# Altium footprint library adafruit.PCBLIB: 648 footprints (part 28 of 41)
Each footprint in its own frame and in the unit in brackets; x right, y up, seen from the top. Pads: shape width x height; smd on the part's side, far side on the other; paste and mask are expansions set on the pad; w line width, h text height; cw(c..) or ccw(c..) is an arc to the next point about the centre after c.
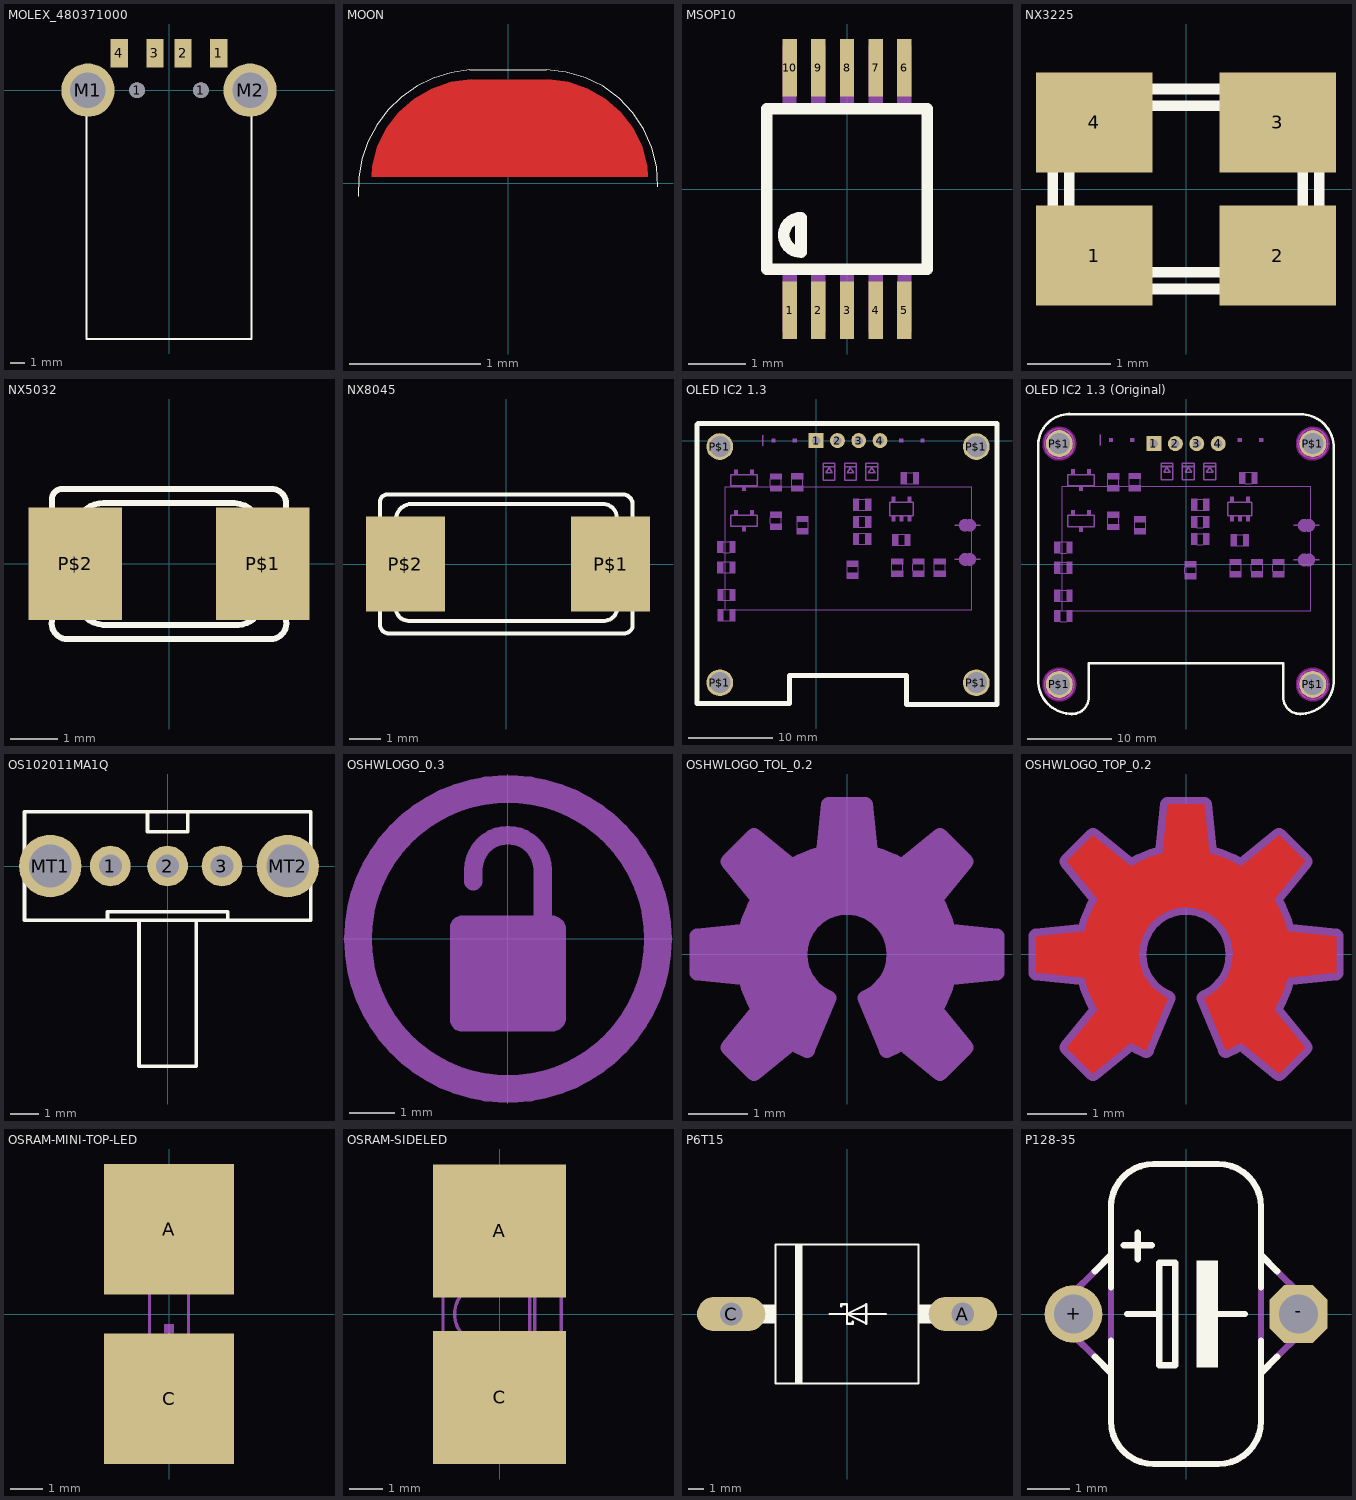
[diagram p27: the footprints below, top view; thin cyan lines are the x and y axes]

## MOLEX_480371000 [mm]
pads (8):
  round 1.1 hole 1.1: 1(-2.25,0) 1(2.25,0)
  rect 1.2x2 smd: 1(3.5,2.6) 2(1,2.6) 3(-1,2.6) 4(-3.5,2.6)
  round 3.75 hole 2.5: M1(-5.7,0) M2(5.7,0)
Top Overlay:
  lines w0.127: -5.8,0 -5.8,-17.5 5.8,-17.5 5.8,0

## MOON [mil]
Top Layer:
  region: -41,2 42,2 41.8,5.05 40.23,10.97 37.52,16.46 33.8,21.31 29.21,25.35 23.91,28.42 18.12,30.39 12.05,31.2 9,31 -8,31 -11.05,31.2 -17.12,30.39 -22.91,28.42 -28.21,25.35 -32.8,21.31 -36.52,16.46 -39.23,10.97 -40.8,5.05
Top Overlay:
  lines w0: -45,-4 cw(c-9.25,-1.75) -11.5,34 11.5,34 cw(c10.74,-0.26) 45,-1

## MSOP10 [mm]
pads (10):
  rect 0.25x1 smd: 1(-1,-2.113) 2(-0.5,-2.113) 3(0,-2.113) 4(0.5,-2.113) 5(1,-2.113) 6(1,2.113) 7(0.5,2.113) 8(0,2.113) 9(-0.5,2.113) 10(-1,2.113)
Top Overlay:
  lines w0.203: -1.4,-1.4 -1.4,1.4 1.4,1.4 1.4,-1.4 -1.4,-1.4 ; -0.8,-1.1 cw(c-0.8,-0.8) -0.8,-0.5 -0.8,-1.1
Mechanical 16:
  region: -0.876,2.5 -1.126,2.5 -1.126,1.5 -0.876,1.5
  region: -0.376,2.5 -0.626,2.5 -0.626,1.5 -0.376,1.5
  region: 0.124,2.5 -0.125,2.5 -0.125,1.5 0.124,1.5
  region: 0.624,2.5 0.374,2.5 0.374,1.5 0.624,1.5
  region: 1.124,2.5 0.875,2.5 0.875,1.5 1.124,1.5
  rectangle: 0.876,-2.5 1.126,-1.5
  rectangle: 0.376,-2.5 0.626,-1.5
  rectangle: -0.124,-2.5 0.125,-1.5
  rectangle: -0.624,-2.5 -0.374,-1.5
  rectangle: -1.124,-2.5 -0.875,-1.5

## NX3225 [mil]
pads (4):
  rect 55.12x47.24 smd: 1(-43.31,-31.5) 2(43.31,-31.5) 3(43.31,31.5) 4(-43.31,31.5)
Top Overlay:
  lines w5: -62.99,-47.24 -62.99,47.24 62.99,47.24 62.99,-47.24 -62.99,-47.24 ; -55.12,-26.87 ccw(c-42.62,-26.87) -42.62,-39.37 42.62,-39.37 ccw(c42.62,-26.87) 55.12,-26.87 55.12,26.87 ccw(c42.62,26.87) 42.62,39.37 -42.62,39.37 ccw(c-42.62,26.87) -55.12,26.87 -55.12,-26.87

## NX5032 [mm]
pads (2):
  rect 2x2.4 smd: P$1(2,0) P$2(-2,0)
Top Overlay:
  lines w0.127: -2.5,-1.217 ccw(c-2.167,-1.267) -2.217,-1.6 2.217,-1.6 ccw(c2.167,-1.267) 2.5,-1.217 2.5,1.284 ccw(c2.184,1.284) 2.184,1.6 -2.276,1.6 ccw(c-2.276,1.376) -2.5,1.376 -2.5,-1.217 ; -2,-0.7 ccw(c-1.35,-0.65) -1.3,-1.3 1.4,-1.3 ccw(c1.45,-0.75) 2,-0.8 2,0.6 ccw(c1.35,0.65) 1.4,1.3 -1.4,1.3 ccw(c-1.4,0.7) -2,0.7 -2,-0.7

## NX8045 [mm]
pads (2):
  rect 2.5x3 smd: P$1(3.3,0) P$2(-3.2,0)
Top Overlay:
  lines w0.127: -4,-1.917 ccw(c-3.717,-1.917) -3.717,-2.2 3.717,-2.2 ccw(c3.717,-1.917) 4,-1.917 4,1.884 ccw(c3.684,1.884) 3.684,2.2 -3.776,2.2 ccw(c-3.776,1.976) -4,1.976 -4,-1.917 ; -3.5,-1.4 ccw(c-3.1,-1.4) -3.1,-1.8 3.1,-1.8 ccw(c3.1,-1.4) 3.5,-1.4 3.5,1.4 ccw(c3.05,1.45) 3.1,1.9 -3,1.9 ccw(c-3,1.4) -3.5,1.4 -3.5,-1.4

## OLED IC2 1.3 [mil] "OLED I2C 128x64 Screen"
pads (8):
  rect 70x70 hole 39.37: 1(0,0)
  round 70 hole 39.37: 2(100,0) 3(200,0) 4(300,0)
  round 125.98 hole 98.43: P$1(-452.76,-1137.95) P$1(-452.76,-27.95) P$1(752.76,-1137.95) P$1(752.76,-27.95)
Top Overlay:
  lines w23.62: -560,75 -560,-1235 -125,-1235 -125,-1105 425,-1105 425,-1240 850,-1240 850,80 -555,80
Mechanical 18:
  rectangle: 490,-10 510,10
  rectangle: -210,-10 -190,10
  rectangle: -110,-10 -90,10
  rectangle: -10,-10 10,10
  rectangle: 90,-10 110,10
  rectangle: 190,-10 210,10
  rectangle: 290,-10 310,10
  rectangle: 390,-10 410,10
  lines w5: -426.7,-794.8 -426.7,-216.06 730.78,-216.06 730.78,-794.8 -426.7,-794.8
  lines w6: -250,-25 -250,25
  text "PCB EDGE" at 49.68,-1019.21 h49.6
  text "41" at 225.58,-138.17 h37.2
  text "41" at 125.58,-138.17 h37.2
  text "41" at 25.58,-138.17 h37.2
Mechanical 19:
  region: 142.43,-620.77 142.43,-650.3 199.52,-650.3 199.52,-620.77
  region: 142.43,-563.77 142.43,-593.3 199.52,-593.3 199.52,-563.77
  region: 448.26,-262.71 428.58,-262.71 428.58,-288.31 448.26,-288.31
  region: 373.46,-262.71 353.78,-262.71 353.78,-288.31 373.46,-288.31
  region: 373.46,-355.23 353.78,-355.23 353.78,-380.83 373.46,-380.83
  region: 410.86,-355.23 391.18,-355.23 391.18,-380.83 410.86,-380.83
  region: 448.26,-355.23 428.58,-355.23 428.58,-380.83 448.26,-380.83
  region: 427.02,-148.18 397.49,-148.18 397.49,-205.27 427.02,-205.27
  region: 484.02,-148.18 454.49,-148.18 454.49,-205.27 484.02,-205.27
  region: 387.02,-438.18 357.49,-438.18 357.49,-495.27 387.02,-495.27
  region: 444.02,-438.18 414.49,-438.18 414.49,-495.27 444.02,-495.27
  region: 233.46,-119.21 233.46,-127.08 288.58,-127.08 288.58,-119.21
  region: 133.46,-119.21 133.46,-127.08 188.58,-127.08 188.58,-119.21
  region: 33.46,-119.21 33.46,-127.08 88.58,-127.08 88.58,-119.21
  rectangle: 230.02,-330.36 259.55,-273.27
  rectangle: 173.02,-330.36 202.55,-273.27
  rectangle: 230.02,-410.36 259.55,-353.27
  rectangle: 173.02,-410.36 202.55,-353.27
  rectangle: 230.02,-490.36 259.55,-433.27
  rectangle: 173.02,-490.36 202.55,-433.27
  region: -92.57,-411.08 -92.57,-440.61 -35.48,-440.61 -35.48,-411.08
  region: -92.57,-354.08 -92.57,-383.61 -35.48,-383.61 -35.48,-354.08
  region: -217.57,-210.77 -217.57,-240.3 -160.48,-240.3 -160.48,-210.77
  region: -217.57,-153.77 -217.57,-183.3 -160.48,-183.3 -160.48,-153.77
  region: -160.39,-363.08 -160.39,-333.55 -217.48,-333.55 -217.48,-363.08
  region: -160.39,-420.08 -160.39,-390.55 -217.48,-390.55 -217.48,-420.08
  region: -60.39,-182.77 -60.39,-153.24 -117.48,-153.24 -117.48,-182.77
  region: -60.39,-239.77 -60.39,-210.24 -117.48,-210.24 -117.48,-239.77
  rectangle: -384.98,-349.08 -366.98,-326.08
  rectangle: -310.98,-349.08 -292.98,-326.08
  rectangle: -347.98,-428.08 -329.98,-405.08
  rectangle: -384.98,-158.77 -366.98,-135.77
  rectangle: -310.98,-158.77 -292.98,-135.77
  rectangle: -347.98,-237.77 -329.98,-214.77
  region: 352.43,-610.77 352.43,-640.3 409.52,-640.3 409.52,-610.77
  region: 352.43,-553.77 352.43,-583.3 409.52,-583.3 409.52,-553.77
  rectangle: -407.58,-849.14 -378.05,-792.05
  rectangle: -464.58,-849.14 -435.05,-792.05
  rectangle: -407.58,-754.14 -378.05,-697.05
  rectangle: -464.58,-754.14 -435.05,-697.05
  region: 552.43,-610.77 552.43,-640.3 609.52,-640.3 609.52,-610.77
  region: 552.43,-553.77 552.43,-583.3 609.52,-583.3 609.52,-553.77
  region: -435.58,-472.27 -465.11,-472.27 -465.11,-529.36 -435.58,-529.36
  region: -378.58,-472.27 -408.11,-472.27 -408.11,-529.36 -378.58,-529.36
  region: 452.43,-610.77 452.43,-640.3 509.52,-640.3 509.52,-610.77
  region: 452.43,-553.77 452.43,-583.3 509.52,-583.3 509.52,-553.77
  region: -435.58,-567.27 -465.11,-567.27 -465.11,-624.36 -435.58,-624.36
  region: -378.58,-567.27 -408.11,-567.27 -408.11,-624.36 -378.58,-624.36
  lines w4: -436.58,-846.53 -406.58,-846.53 ; -436.58,-751.53 -406.58,-751.53 ; -436.58,-621.84 -407.56,-621.84 ; -436.58,-569.88 -406.58,-569.88 ; -436.58,-526.84 -407.56,-526.84 ; -436.58,-474.88 -406.58,-474.88 ; -435.6,-794.57 -406.58,-794.57 ; -435.6,-699.57 -406.58,-699.57 ; -214.96,-391.1 -214.96,-362.08 ; -214.96,-211.77 -214.96,-181.77 ; -163,-392.08 -163,-362.08 ; -163,-211.77 -163,-182.75 ; -114.96,-210.79 -114.96,-181.77 ; -89.96,-412.08 -89.96,-382.08 ; -63,-211.77 -63,-181.77 ; -38,-412.08 -38,-383.06 ; 145.04,-621.77 145.04,-591.77 ; 197,-621.77 197,-592.75 ; 201.02,-487.75 231.02,-487.75 ; 201.02,-407.75 231.02,-407.75 ; 201.02,-327.75 231.02,-327.75 ; 202,-435.79 231.02,-435.79 ; 202,-355.79 231.02,-355.79 ; 202,-275.79 231.02,-275.79 ; 355.04,-611.77 355.04,-581.77 ; 386.02,-492.75 415.04,-492.75 ; 386.02,-440.79 416.02,-440.79 ; 407,-611.77 407,-582.75 ; 426.02,-202.75 455.04,-202.75 ; 426.02,-150.79 456.02,-150.79 ; 455.04,-611.77 455.04,-581.77 ; 507,-611.77 507,-582.75 ; 555.04,-611.77 555.04,-581.77 ; 607,-611.77 607,-582.75
  lines w6: 651.02,-558.66 671.02,-558.66 ; 651.02,-398.03 671.02,-398.03 ; 751.02,-558.66 771.02,-558.66 ; 751.02,-398.03 771.02,-398.03 ; -400.89,-403.08 -277.07,-403.08 -277.07,-351.08 -400.89,-351.08 -400.89,-403.08 ; -400.89,-212.77 -277.07,-212.77 -277.07,-160.77 -400.89,-160.77 -400.89,-212.77 ; 33.46,-186.14 88.58,-186.14 88.58,-107.4 33.46,-107.4 33.46,-186.14 ; 45.27,-150.71 76.77,-150.71 61.02,-127.08 45.27,-150.71 ; 133.46,-186.14 188.58,-186.14 188.58,-107.4 133.46,-107.4 133.46,-186.14 ; 145.27,-150.71 176.77,-150.71 161.02,-127.08 145.27,-150.71 ; 233.46,-186.14 288.58,-186.14 288.58,-107.4 233.46,-107.4 233.46,-186.14 ; 245.27,-150.71 276.77,-150.71 261.02,-127.08 245.27,-150.71 ; 345.02,-353.68 457.02,-353.68 457.02,-289.86 345.02,-289.86 345.02,-353.68
  lines w50: 701.02,-563.66 cw(c701.02,-558.66) 701.02,-553.66 ; 701.02,-403.03 cw(c701.02,-398.03) 701.02,-393.03 ; 721.02,-563.66 ccw(c721.02,-558.66) 721.02,-553.66 ; 721.02,-403.03 ccw(c721.02,-398.03) 721.02,-393.03
  text "30" at 563.46,-688.03 h27.2
  text "20" at 281.96,-688.03 h27.2
  text "10" at 8.34,-688.03 h27.2
  text "1" at -239.69,-684.09 h27.2
3D body "1 3 OLED ICC .STEP": height 208.66, standoff -216.54, extent -556.78,-1240.78 846.77,82.05

## OLED IC2 1.3 (Original) [mm] "OLED I2C 128x64 Screen"
pads (8):
  rect 1.778x1.778 hole 1: 1(-3.81,14.25)
  round 1.778 hole 1: 2(-1.27,14.25) 3(1.27,14.25) 4(3.81,14.25)
  round 3.2 hole 2.5: P$1(-15,-14.25) P$1(-15,14.25) P$1(15,-14.25) P$1(15,14.25)
Top Overlay:
  lines w0.3: -17.5,14.25 -17.5,-13.75 ccw(c-13.5,-13.75) -13.5,-17.75 ccw(c-13.5,-15.75) -11.5,-15.75 -11.5,-11.75 11.5,-11.75 11.5,-15.75 ccw(c13.5,-15.75) 13.5,-17.75 ccw(c13.5,-13.75) 17.5,-13.75 17.5,13.75 ccw(c13.5,13.75) 13.5,17.75 -13.5,17.75 ccw(c-13.75,14) -17.5,14.25
Keep-Out Layer:
  circle w2.032: c-15,14.25 r1
  circle w2.032: c15,-14.25 r1
  circle w2.032: c-15,-14.25 r1
  circle w2.032: c15,14.25 r1
Mechanical 1:
  lines w0: -17.5,14.25 -17.5,-13.75 ccw(c-13.5,-13.75) -13.5,-17.75 ccw(c-13.5,-15.75) -11.5,-15.75 -11.5,-11.75 11.5,-11.75 11.5,-15.75 ccw(c13.5,-15.75) 13.5,-17.75 ccw(c13.5,-13.75) 17.5,-13.75 17.5,13.75 ccw(c13.5,13.75) 13.5,17.75 -13.5,17.75 ccw(c-13.75,14) -17.5,14.25
Mechanical 2:
  circle w0.152: c-15,14.25 r1.75
  circle w0.152: c15,-14.25 r1.75
  circle w0.152: c-15,-14.25 r1.75
  circle w0.152: c15,14.25 r1.75
Mechanical 18:
  rectangle: 6.096,14.426 6.604,14.934
  rectangle: 3.556,14.426 4.064,14.934
  rectangle: 1.016,14.426 1.524,14.934
  rectangle: -1.524,14.426 -1.016,14.934
  rectangle: -4.064,14.426 -3.556,14.934
  rectangle: -6.604,14.426 -6.096,14.934
  rectangle: -9.144,14.426 -8.636,14.934
  rectangle: 8.636,14.426 9.144,14.934
  lines w0.127: -14.648,-5.508 14.752,-5.508 14.752,9.192 -14.648,9.192 -14.648,-5.508
  lines w0.152: -10.16,14.045 -10.16,15.315
  text "41" at -3.16,11.17 h0.94
  text "41" at -0.62,11.17 h0.94
  text "41" at 1.92,11.17 h0.94
  text "PCB EDGE" at -2.548,-11.208 h1.26
Mechanical 19:
  region: -13.426,0.271 -14.176,0.271 -14.176,-1.179 -13.426,-1.179
  region: -14.874,0.271 -15.624,0.271 -15.624,-1.179 -14.874,-1.179
  region: 7.682,0.614 7.682,-0.136 9.132,-0.136 9.132,0.614
  region: 7.682,-0.834 7.682,-1.584 9.132,-1.584 9.132,-0.834
  region: -13.426,2.684 -14.176,2.684 -14.176,1.234 -13.426,1.234
  region: -14.874,2.684 -15.624,2.684 -15.624,1.234 -14.874,1.234
  region: 10.222,0.614 10.222,-0.136 11.672,-0.136 11.672,0.614
  region: 10.222,-0.834 10.222,-1.584 11.672,-1.584 11.672,-0.834
  rectangle: -15.61,-4.475 -14.86,-3.025
  rectangle: -14.162,-4.475 -13.412,-3.025
  rectangle: -15.61,-6.888 -14.86,-5.438
  rectangle: -14.162,-6.888 -13.412,-5.438
  region: 5.142,0.614 5.142,-0.136 6.592,-0.136 6.592,0.614
  region: 5.142,-0.834 5.142,-1.584 6.592,-1.584 6.592,-0.834
  rectangle: -12.649,8.641 -12.191,9.225
  rectangle: -11.709,10.647 -11.252,11.231
  rectangle: -13.588,10.647 -13.131,11.231
  rectangle: -12.649,3.807 -12.191,4.391
  rectangle: -11.709,5.813 -11.252,6.397
  rectangle: -13.588,5.813 -13.131,6.397
  region: -5.344,8.59 -5.344,9.34 -6.794,9.34 -6.794,8.59
  region: -5.344,10.038 -5.344,10.788 -6.794,10.788 -6.794,10.038
  region: -7.884,4.01 -7.884,4.76 -9.334,4.76 -9.334,4.01
  region: -7.884,5.458 -7.884,6.208 -9.334,6.208 -9.334,5.458
  region: -9.336,10.774 -9.336,10.024 -7.886,10.024 -7.886,10.774
  region: -9.336,9.326 -9.336,8.576 -7.886,8.576 -7.886,9.326
  region: -6.161,5.686 -6.161,4.936 -4.711,4.936 -4.711,5.686
  region: -6.161,4.238 -6.161,3.488 -4.711,3.488 -4.711,4.238
  rectangle: 0.585,2.225 1.335,3.675
  rectangle: 2.033,2.225 2.783,3.675
  rectangle: 0.585,4.257 1.335,5.707
  rectangle: 2.033,4.257 2.783,5.707
  rectangle: 0.585,6.289 1.335,7.739
  rectangle: 2.033,6.289 2.783,7.739
  region: -2.96,11.652 -2.96,11.452 -1.56,11.452 -1.56,11.652
  region: -0.42,11.652 -0.42,11.452 0.98,11.452 0.98,11.652
  region: 2.12,11.652 2.12,11.452 3.52,11.452 3.52,11.652
  region: 7.468,3.55 6.718,3.55 6.718,2.1 7.468,2.1
  region: 6.02,3.55 5.27,3.55 5.27,2.1 6.02,2.1
  region: 8.484,10.916 7.734,10.916 7.734,9.466 8.484,9.466
  region: 7.036,10.916 6.286,10.916 6.286,9.466 7.036,9.466
  region: 7.576,5.657 7.076,5.657 7.076,5.007 7.576,5.007
  region: 6.626,5.657 6.126,5.657 6.126,5.007 6.626,5.007
  region: 5.676,5.657 5.176,5.657 5.176,5.007 5.676,5.007
  region: 5.676,8.007 5.176,8.007 5.176,7.357 5.676,7.357
  region: 7.576,8.007 7.076,8.007 7.076,7.357 7.576,7.357
  region: -0.192,0.36 -0.192,-0.39 1.258,-0.39 1.258,0.36
  region: -0.192,-1.088 -0.192,-1.838 1.258,-1.838 1.258,-1.088
  lines w0.102: -14.899,-6.822 -14.137,-6.822 ; -14.899,-4.409 -14.137,-4.409 ; -14.899,-1.115 -14.162,-1.115 ; -14.899,0.205 -14.137,0.205 ; -14.899,1.298 -14.162,1.298 ; -14.899,2.618 -14.137,2.618 ; -14.874,-5.502 -14.137,-5.502 ; -14.874,-3.089 -14.137,-3.089 ; -9.27,4.746 -9.27,5.483 ; -9.27,9.301 -9.27,10.063 ; -7.95,4.721 -7.95,5.483 ; -7.95,9.301 -7.95,10.038 ; -6.73,9.326 -6.73,10.063 ; -6.095,4.213 -6.095,4.975 ; -5.41,9.301 -5.41,10.063 ; -4.775,4.213 -4.775,4.95 ; -0.126,-1.113 -0.126,-0.351 ; 1.194,-1.113 1.194,-0.376 ; 1.296,2.291 2.058,2.291 ; 1.296,4.323 2.058,4.323 ; 1.296,6.355 2.058,6.355 ; 1.321,3.611 2.058,3.611 ; 1.321,5.643 2.058,5.643 ; 1.321,7.675 2.058,7.675 ; 5.208,-0.859 5.208,-0.097 ; 5.995,2.164 6.732,2.164 ; 5.995,3.484 6.757,3.484 ; 6.528,-0.859 6.528,-0.122 ; 7.011,9.53 7.748,9.53 ; 7.011,10.85 7.773,10.85 ; 7.748,-0.859 7.748,-0.097 ; 9.068,-0.859 9.068,-0.122 ; 10.288,-0.859 10.288,-0.097 ; 11.608,-0.859 11.608,-0.122
  lines w0.152: 12.726,0.49 13.234,0.49 ; 12.726,4.57 13.234,4.57 ; 15.266,0.49 15.774,0.49 ; 15.266,4.57 15.774,4.57 ; -13.992,4.442 -13.992,5.762 -10.847,5.762 -10.847,4.442 -13.992,4.442 ; -13.992,9.276 -13.992,10.596 -10.847,10.596 -10.847,9.276 -13.992,9.276 ; -2.96,9.952 -2.96,11.952 -1.56,11.952 -1.56,9.952 -2.96,9.952 ; -2.66,10.852 -2.26,11.452 -1.86,10.852 -2.66,10.852 ; -0.42,9.952 -0.42,11.952 0.98,11.952 0.98,9.952 -0.42,9.952 ; -0.12,10.852 0.28,11.452 0.68,10.852 -0.12,10.852 ; 2.12,9.952 2.12,11.952 3.52,11.952 3.52,9.952 2.12,9.952 ; 2.42,10.852 2.82,11.452 3.22,10.852 2.42,10.852 ; 4.954,5.696 4.954,7.317 7.798,7.317 7.798,5.696 4.954,5.696
  lines w1.27: 13.996,0.363 cw(c13.996,0.49) 13.996,0.617 ; 13.996,4.443 cw(c13.996,4.57) 13.996,4.697 ; 14.504,0.363 ccw(c14.504,0.49) 14.504,0.617 ; 14.504,4.443 ccw(c14.504,4.57) 14.504,4.697
  text "1" at -9.898,-2.696 h0.69
  text "10" at -3.598,-2.796 h0.69
  text "20" at 3.352,-2.796 h0.69
  text "30" at 10.502,-2.796 h0.69

## OS102011MA1Q [mil]
pads (5):
  round 56 hole 31.5: 1(-78.74,0) 2(0,0) 3(74.8,0)
  round 86 hole 59.06: MT1(-161.42,0) MT2(165.35,0)
Top Overlay:
  lines w5: -82.68,-74.8 -39.37,-74.8 ; -82.68,-74.8 -196.85,-74.8 -196.85,74.8 -27.56,74.8 ; -82.68,-74.8 -82.68,-62.99 82.68,-62.99 82.68,-74.8 ; -39.37,-74.8 39.37,-74.8 ; -39.37,-74.8 -39.37,-275.59 39.37,-275.59 39.37,-74.8 ; -27.56,74.8 27.56,74.8 ; -27.56,74.8 -27.56,47.24 27.56,47.24 27.56,74.8 ; 27.56,74.8 196.85,74.8 196.85,-74.8 82.68,-74.8 ; 39.37,-74.8 82.68,-74.8

## OSHWLOGO_0.3 [mil]
Mechanical 16:
  circle w24: c0,0 r130
  region: 50,-68 50,-70.39 48.17,-74.8 44.8,-78.17 40.39,-80 38,-80 -40,-80 -41.99,-80 -45.66,-78.48 -48.48,-75.66 -50,-71.99 -50,-70 -50,10 -50,11.99 -48.48,15.66 -45.66,18.48 -41.99,20 -40,20 38,20 40.39,20 44.8,18.17 48.17,14.8 50,10.39 50,8
  lines w16: -30,50 -30,60 cw(c0,60) 0,90 cw(c0,60) 30,60 30,20

## OSHWLOGO_TOL_0.2 [mil]
Mechanical 16:
  region: 26.31,-63.52 27.63,-62.97 30.21,-61.77 32.74,-60.47 35.22,-59.06 36.43,-58.3 61.57,-78.8 78.8,-61.57 58.3,-36.43 59.81,-34.01 62.42,-28.94 64.61,-23.67 66.35,-18.24 66.99,-15.46 99.26,-12.19 99.26,12.19 66.99,15.46 66.35,18.24 64.61,23.67 62.42,28.94 59.81,34.01 58.3,36.43 78.8,61.57 61.57,78.8 36.43,58.3 34.01,59.81 28.94,62.42 23.67,64.61 18.24,66.35 15.46,66.99 12.19,99.26 -12.19,99.26 -15.46,66.99 -18.24,66.35 -23.67,64.61 -28.94,62.42 -34.01,59.81 -36.43,58.3 -61.57,78.8 -78.8,61.57 -58.3,36.43 -59.81,34.01 -62.42,28.94 -64.61,23.67 -66.35,18.24 -66.99,15.46 -99.26,12.19 -99.26,-12.19 -66.99,-15.46 -66.35,-18.24 -64.61,-23.67 -62.42,-28.94 -59.81,-34.01 -58.3,-36.43 -78.8,-61.57 -61.57,-78.8 -36.43,-58.3 -35.22,-59.06 -32.74,-60.47 -30.21,-61.77 -27.63,-62.97 -26.31,-63.52 -11.96,-28.87 -16.07,-26.8 -23.16,-20.99 -28.25,-13.36 -30.91,-4.59 -31.25,0 -30.97,4.21 -28.72,12.31 -24.4,19.52 -18.31,25.32 -10.89,29.29 -2.68,31.13 5.72,30.72 13.7,28.08 20.7,23.41 26.19,17.04 29.79,9.44 31.22,1.15 30.4,-7.22 27.37,-15.07 22.37,-21.82 15.74,-27 11.96,-28.87
  lines w10: -99.26,-12.19 -99.26,12.19 -66.99,15.46 cw(c0.01,-0.02) -58.3,36.43 -78.8,61.57 -61.57,78.8 -36.43,58.3 cw(c0.02,-0.01) -15.46,66.99 -12.19,99.26 12.19,99.26 15.46,66.99 cw(c-0.02,-0.01) 36.43,58.3 61.57,78.8 78.8,61.57 58.3,36.43 cw(c-0.01,-0.02) 66.99,15.46 99.26,12.19 99.26,-12.19 66.99,-15.46 cw(c-0.01,0.02) 58.3,-36.43 78.8,-61.57 61.57,-78.8 36.43,-58.3 cw(c-0.04,-0.02) 26.31,-63.52 11.96,-28.87 ccw(c0,0) -31.25,0 ccw(c-0.01,0) -11.96,-28.87 -26.31,-63.52 cw(c0.04,-0.02) -36.43,-58.3 -61.57,-78.8 -78.8,-61.57 -58.3,-36.43 cw(c0.01,0.02) -66.99,-15.46 -99.26,-12.19

## OSHWLOGO_TOP_0.2 [mil]
Top Layer:
  region: 26.31,-63.52 27.63,-62.97 30.21,-61.77 32.74,-60.47 35.22,-59.06 36.43,-58.3 61.57,-78.8 78.8,-61.57 58.3,-36.43 59.81,-34.01 62.42,-28.94 64.61,-23.67 66.35,-18.24 66.99,-15.46 99.26,-12.19 99.26,12.19 66.99,15.46 66.35,18.24 64.61,23.67 62.42,28.94 59.81,34.01 58.3,36.43 78.8,61.57 61.57,78.8 36.43,58.3 34.01,59.81 28.94,62.42 23.67,64.61 18.24,66.35 15.46,66.99 12.19,99.26 -12.19,99.26 -15.46,66.99 -18.24,66.35 -23.67,64.61 -28.94,62.42 -34.01,59.81 -36.43,58.3 -61.57,78.8 -78.8,61.57 -58.3,36.43 -59.81,34.01 -62.42,28.94 -64.61,23.67 -66.35,18.24 -66.99,15.46 -99.26,12.19 -99.26,-12.19 -66.99,-15.46 -66.35,-18.24 -64.61,-23.67 -62.42,-28.94 -59.81,-34.01 -58.3,-36.43 -78.8,-61.57 -61.57,-78.8 -36.43,-58.3 -35.22,-59.06 -32.74,-60.47 -30.21,-61.77 -27.63,-62.97 -26.31,-63.52 -11.96,-28.87 -16.07,-26.8 -23.16,-20.99 -28.25,-13.36 -30.91,-4.59 -31.25,0 -30.97,4.21 -28.72,12.31 -24.4,19.52 -18.31,25.32 -10.89,29.29 -2.68,31.13 5.72,30.72 13.7,28.08 20.7,23.41 26.19,17.04 29.79,9.44 31.22,1.15 30.4,-7.22 27.37,-15.07 22.37,-21.82 15.74,-27 11.96,-28.87
Mechanical 16:
  lines w10: -99.26,-12.19 -66.99,-15.46 ccw(c0.01,0.02) -58.3,-36.43 -78.8,-61.57 -61.57,-78.8 -36.43,-58.3 ccw(c0.04,-0.02) -26.31,-63.52 -11.96,-28.87 cw(c-0.01,0) -31.25,0 cw(c0,0) 11.96,-28.87 26.31,-63.52 ccw(c-0.04,-0.02) 36.43,-58.3 61.57,-78.8 78.8,-61.57 58.3,-36.43 ccw(c-0.01,0.02) 66.99,-15.46 99.26,-12.19 99.26,12.19 66.99,15.46 ccw(c-0.01,-0.02) 58.3,36.43 78.8,61.57 61.57,78.8 36.43,58.3 ccw(c-0.02,-0.01) 15.46,66.99 12.19,99.26 -12.19,99.26 -15.46,66.99 ccw(c0.02,-0.01) -36.43,58.3 -61.57,78.8 -78.8,61.57 -58.3,36.43 ccw(c0.01,-0.02) -66.99,15.46 -99.26,12.19 -99.26,-12.19

## OSRAM-MINI-TOP-LED [mm]
pads (2):
  rect 4x4 smd: A(0,2.6) C(0,-2.6)
Top Overlay:
  text "C" at -0.635,-3.175 h1.97
  text "A" at -0.635,1.905 h1.97
Top Paste:
  rectangle: -0.45,-1.35 0.45,-0.65
  rectangle: -0.45,0.65 0.45,1.35
  rectangle: -0.5,-1.4 0.5,-0.6
  rectangle: -0.5,0.6 0.5,1.4
Mechanical 16:
  rectangle: -0.15,-0.6 0.15,-0.3
  lines w0.102: -0.45,0.95 -0.45,1.1 0.45,1.1 0.45,0.95 ; 0.45,-0.95 0.45,-1.1 -0.45,-1.1 -0.45,-0.9 -0.4,-0.9 ; -0.4,-0.9 -0.6,-0.7 -0.6,0.9 0.6,0.9 0.6,-0.9 -0.4,-0.9

## OSRAM-SIDELED [mm]
pads (2):
  rect 4x4 smd: A(0,2.5) C(0,-2.5)
Top Overlay:
  text "A" at 0.635,2.54 h1.97
  text "C" at 0.635,-3.175 h1.97
Top Paste:
  rectangle: -1.9,0.6 1.9,2.1
  rectangle: -1.9,-2.1 1.9,-0.6
Top Solder:
  rectangle: -2.1,0.4 2.1,2.2
  rectangle: -2.1,-2.2 2.1,-0.4
Mechanical 16:
  rectangle: -1.85,-2.05 -0.7,-1
  lines w0.102: 0.85,-1.2 -0.55,-0.9 cw(c-0.45,0) -0.55,0.9 0.85,1.2 ; 0.9,-2.05 1.05,-2.05 ; 0.9,-2.05 -1.85,-2.05 -1.85,-0.75 -1.7,-0.75 -1.7,0.75 -1.85,0.75 -1.85,2.05 0.9,2.05 ; 0.9,-2.05 0.9,2.05 ; 0.9,2.05 1.05,2.05 ; 1.05,-2.05 1.05,2.05 ; 1.05,-2.05 1.85,-1.85 1.85,1.85 1.05,2.05

## P6T15 [mil]
pads (2):
  oval 177x88.5 hole 59: A(300,0) C(-300,0)
Top Overlay:
  rectangle: -135,-180 -115,180
  rectangle: 185,-25 235,25
  rectangle: -235,-25 -185,25
  lines w6: -45,0 0,0 ; -15,20 -15,25 0,25 0,0 ; 15,-20 15,-25 0,-25 0,0 ; 100,0 0,0 ; 0,0 50,25 50,-25 0,0 ; -185,-180 -185,180 185,180 185,-180 -185,-180
Mechanical 16:
  lines w50: -300,0 -245,0 ; 245,0 300,0

## P128-35 [mil]
pads (2):
  round 54 hole 36: +(-105,0)
  oct 54x54 hole 36: -(105,0)
Top Overlay:
  rectangle: 10,-50 30,50
  lines w6: -85,-40 -70,-55 ; -85,40 -70,55 ; -70,-25 -70,-55 ; -70,25 -70,55 ; -70,100 cw(c-30,100) -30,140 30,140 cw(c30,100) 70,100 70,55 ; -70,105 -70,55 ; -58,64 -32,64 ; -55,0 -25,0 ; -45,51 -45,76 ; 25,0 55,0 ; 70,-25 70,-55 ; 70,25 70,55 ; 85,-40 70,-55 ; 85,40 70,55 ; -70,-55 -70,-100 ccw(c-30,-100) -30,-140 30,-140 ccw(c30,-100) 70,-100 70,-55 ; -25,0 -25,48 -10,48 -10,-48 -25,-48 -25,0
Mechanical 16:
  lines w6: -85,-40 -105,-20 cw(c-105,0) -105,20 -85,40 ; -70,-25 -70,25 ; 70,-25 70,25 ; 85,-40 105,-20 ccw(c105,0) 105,20 85,40